# Altium footprint library my Library.PcbLib: 1247 footprints (part 49 of 78)
Each footprint in its own frame and in the unit in brackets; x right, y up, seen from the top. Pads: shape width x height; smd on the part's side, far side on the other; paste and mask are expansions set on the pad; w line width, h text height; cw(c..) or ccw(c..) is an arc to the next point about the centre after c.
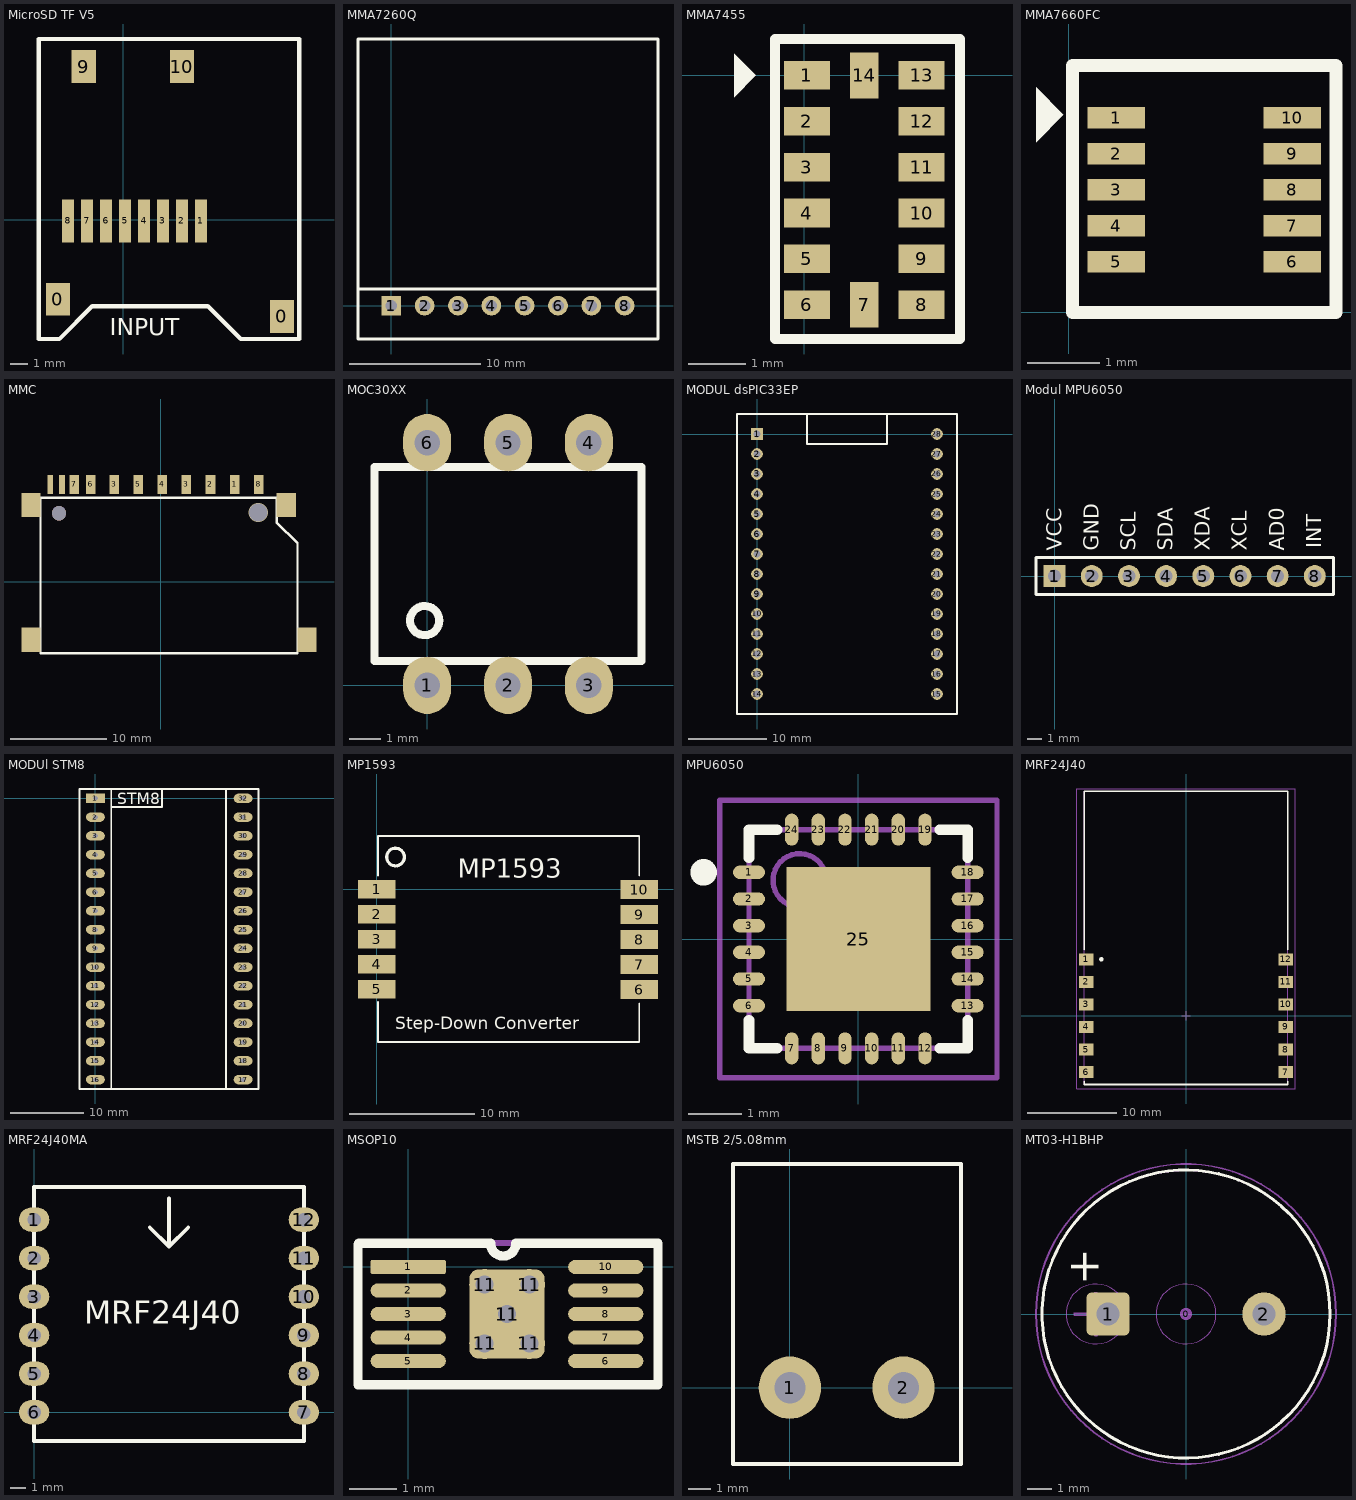
[diagram p48: the footprints below, top view; thin cyan lines are the x and y axes]

## MicroSD TF V5 [mm]
pads (12):
  rect 1.4x1.9 smd: 0(-3.8,-4.6) 0(9.2,-5.6) 9(-2.3,8.9) 10(3.4,8.9)
  rect 0.7x2.5 smd: 1(4.5,-0.054) 2(3.4,-0.054) 3(2.3,-0.054) 4(1.2,-0.054) 5(0.1,-0.054) 6(-1,-0.054) 7(-2.1,-0.054) 8(-3.2,-0.054)
Top Overlay:
  lines w0.254: -4.9,-6.909 -3.979,-6.909 -3.709,-6.909 -1.8,-5 4.9,-5 6.809,-6.909 10.2,-6.909 10.2,10.5 6.4,10.5 -1.4,10.5 -4.9,10.5 -4.9,-6.909
  text "INPUT" at -0.8,-6.7 h1
3D body "User Library-473521001_microSD.STEP": height 2, standoff 0.12, extent -4.35,-5.54 9.75,9.66

## MMA7260Q [mm] "Connector; Header; 8 Position"
pads (8):
  rect 1.5x1.5 hole 0.9: 1(0,0)
  round 1.5 hole 0.9: 2(2.54,0) 3(5.08,0) 4(7.62,0) 5(10.16,0) 6(12.7,0) 7(15.24,0) 8(17.78,0)
Top Overlay:
  lines w0.2: -2.54,1.27 20.32,1.27 ; -2.54,-2.54 20.32,-2.54 20.32,20.32 -2.54,20.32 -2.54,-2.54
3D body: height 1, standoff 0, extent -2.54,-2.54 20.32,20.32
3D body: height 2, standoff 1, extent 7.62,7.62 13.97,13.97

## MMA7455 [mm]
pads (14):
  rect 0.8x0.5 smd: 1(0.051,0) 2(0.051,-0.8) 3(0.051,-1.6) 4(0.051,-2.4) 5(0.051,-3.2) 6(0.051,-4) 8(2.051,-4) 9(2.051,-3.2) 10(2.051,-2.4) 11(2.051,-1.6) 12(2.051,-0.8) 13(2.051,0)
  rect 0.5x0.8 smd: 7(1.051,-4) 14(1.051,0)
Top Overlay:
  region: -1.219,0.381 -0.838,0 -1.219,-0.381
  lines w0.178: -0.508,-4.572 -0.508,0.635 2.718,0.635 2.718,-4.597 ; 2.718,-4.597 -0.508,-4.597 2.718,-4.597

## MMA7660FC [mm]
pads (10):
  rect 0.8x0.3 smd: 1(0.655,2.704) 2(0.655,2.204) 3(0.655,1.704) 4(0.655,1.204) 5(0.655,0.704) 6(3.099,0.704) 7(3.099,1.204) 8(3.099,1.704) 9(3.099,2.204) 10(3.099,2.704)
Top Overlay:
  region: -0.457,3.124 -0.076,2.743 -0.457,2.362
  lines w0.178: 0.051,0 0.051,3.429 3.708,3.429 3.708,0 0.051,0
3D body "User Library-DFN 10 Body 3x3mm Pitch 0_5mm.STEP": height 0.9, standoff -0.05, extent 0.33,0.152 3.43,3.252

## MMC [mm]
pads (15):
  rect 1x2 smd: 1(7.67,10.109) 2(5.17,10.109) 3(-4.83,10.109) 3(2.67,10.109) 4(0.17,10.109) 5(-2.33,10.109) 6(-7.255,10.109) 7(-8.955,10.109) 8(10.17,10.109)
  rect 2x2.5 smd: ""(-13.455,-6.02) ""(-13.455,7.95) ""(13.024,7.95) ""(15.183,-6.02)
  rect 0.6x2 smd: ""(-11.455,10.109) ""(-10.255,10.109)
via -10.555,7.109 diameter 1.476 hole 1.476
via 10.135,7.188 diameter 2 hole 1.898
Top Overlay:
  lines w0.254: -12.471,-7.417 -12.471,8.712 12.04,8.712 12.04,6.172 14.199,4.013 14.199,-7.417 -12.471,-7.417
3D body "User Library-SD Kart.step": height 3, standoff -1, extent -13.436,-20.196 15.164,9.804

## MOC30XX [mm]
pads (6):
  oval 1.5x1.8 hole 0.8: 1(0,0) 2(2.54,0) 3(5.08,0) 4(5.08,7.62) 5(2.54,7.62) 6(0,7.62)
Top Overlay:
  circle w0.254: c-0.077,2.032 r0.458
  lines w0.254: -1.651,0.762 6.731,0.762 6.731,6.858 -1.651,6.858 -1.651,0.762
3D body "SW3DPS-DIP6-DEFAULT.step": height 4.41, standoff -3.18, extent -1.5,-0.19 6.58,7.81

## MODUL dsPIC33EP [mm] "Connector; Header; 14 Position"
height 1.14
pads (28):
  rect 1.5x1.5 hole 0.9: 1(0,0)
  round 1.5 hole 0.9: 2(0,-2.54) 3(0,-5.08) 4(0,-7.62) 5(0,-10.16) 6(0,-12.7) 7(0,-15.24) 8(0,-17.78) 9(0,-20.32) 10(0,-22.86) 11(0,-25.4) 12(0,-27.94) 13(0,-30.48) 14(0,-33.02) 15(22.86,-33.02) 16(22.86,-30.48) 17(22.86,-27.94) 18(22.86,-25.4) 19(22.86,-22.86) 20(22.86,-20.32) 21(22.86,-17.78) 22(22.86,-15.24) 23(22.86,-12.7) 24(22.86,-10.16) 25(22.86,-7.62) 26(22.86,-5.08) 27(22.86,-2.54) 28(22.86,0)
Top Overlay:
  lines w0.2: -2.54,2.54 -2.54,-35.56 25.4,-35.56 25.4,-0.635
  lines w0.254: -2.54,2.54 25.4,2.54 25.4,-0.635 ; 6.35,2.54 6.35,-1.27 16.51,-1.27 16.51,2.54

## Modul MPU6050 [mm] "Connector; Header; 8 Position"
height 1.14
pads (8):
  rect 1.5x1.5 hole 0.9: 1(0,0)
  round 1.5 hole 0.9: 2(2.54,0) 3(5.08,0) 4(7.62,0) 5(10.16,0) 6(12.7,0) 7(15.24,0) 8(17.78,0)
Top Overlay:
  lines w0.2: -1.27,-1.27 19.05,-1.27 19.05,1.27 -1.27,1.27 -1.27,-1.27
  text "VCC" at 0.483,1.727 h1.02
  text "GND" at 3.015,1.727 h1.02
  text "SCL" at 5.548,1.727 h1.02
  text "SDA" at 8.081,1.727 h1.02
  text "XDA" at 10.614,1.727 h1.02
  text "XCL" at 13.146,1.727 h1.02
  text "AD0" at 15.679,1.727 h1.02
  text "INT" at 18.212,1.896 h1.02
3D body "female_header_a-bl254-eg-g08d.stp": height 7.92, standoff -3.78, extent -1.395,-1.257 19.175,1.243

## MODUl STM8 [mm]
pads (32):
  rect 2.54x1.27 hole 0.635: 1(0,0)
  oval 2.54x1.27 hole 0.635: 2(0,-2.54) 3(0,-5.08) 4(0,-7.62) 5(0,-10.16) 6(0,-12.7) 7(0,-15.24) 8(0,-17.78) 9(0,-20.32) 10(0,-22.86) 11(0,-25.4) 12(0,-27.94) 13(0,-30.48) 14(0,-33.02) 15(0,-35.56) 16(0,-38.1) 17(20,-38.1) 18(20,-35.56) 19(20,-33.02) 20(20,-30.48) 21(20,-27.94) 22(20,-25.4) 23(20,-22.86) 24(20,-20.32) 25(20,-17.78) 26(20,-15.24) 27(20,-12.7) 28(20,-10.16) 29(20,-7.62) 30(20,-5.08) 31(20,-2.54) 32(20,0)
Top Overlay:
  lines w0.254: 2.14,-39.31 2.14,1.27 ; 2.14,-1.168 9.017,-1.168 9.017,1.27 ; 17.695,-39.31 17.695,1.27 ; -2.155,-39.37 22.085,-39.37 22.085,1.27 -2.155,1.27 -2.155,-39.37
  text "STM8" at 2.94,-0.77 h1.52

## MP1593 [mm]
height 5
pads (10):
  rect 3x1.5 smd: 1(0,0) 2(0,-2) 3(0,-4) 4(0,-6) 5(0,-8) 6(21,-8.025) 7(21,-6.025) 8(21,-4.025) 9(21,-2.025) 10(21,-0.025)
Top Overlay:
  circle w0.254: c1.5,2.575 r0.707
  lines w0.127: 0.1,-9.025 0.1,-12.225 21,-12.225 21,-9.125 ; 0.1,1.075 0.1,4.26 21,4.26 21,1.075
  text "Step-Down Converter" at 1.5,-11.2 h1
  text "MP1593" at 6.5,0.9 h1.52
3D body: height 5, standoff 0, extent 0,-12.2 21,4.3
3D body: height 5.1, standoff 0, extent 1.104,2.001 2.1,2.999

## MPU6050 [mm] "QFN-24N"
pads (25):
  oval 0.6x0.25 smd: 1(-2.05,1.25) 2(-2.05,0.75) 3(-2.05,0.25) 4(-2.05,-0.25) 5(-2.05,-0.75) 6(-2.05,-1.25) 13(2.05,-1.25) 14(2.05,-0.75) 15(2.05,-0.25) 16(2.05,0.25) 17(2.05,0.75) 18(2.05,1.25)
  oval 0.25x0.6 smd: 7(-1.25,-2.05) 8(-0.75,-2.05) 9(-0.25,-2.05) 10(0.25,-2.05) 11(0.75,-2.05) 12(1.25,-2.05) 19(1.25,2.05) 20(0.75,2.05) 21(0.25,2.05) 22(-0.25,2.05) 23(-0.75,2.05) 24(-1.25,2.05)
  rect 2.7x2.7 smd: 25(0,0)
Top Overlay:
  circle w0.25: c-2.9,1.25 r0.125
  lines w0.2: -2.05,-1.525 -2.05,-2.05 -1.525,-2.05 ; -2.05,1.525 -2.05,2.05 -1.525,2.05 ; 1.525,-2.05 2.05,-2.05 2.05,-1.525 ; 1.525,2.05 2.05,2.05 2.05,1.525
Mechanical 13:
  circle w0.1: c-1.1,1.1 r0.5
  lines w0.1: -2.05,-2.05 2.05,-2.05 2.05,2.05 -2.05,2.05 -2.05,-2.05
Mechanical 15:
  lines w0.1: -0.5,0 0.5,0 ; 0,-0.5 0,0.5 ; -2.6,-2.6 2.6,-2.6 2.6,2.6 -2.6,2.6 -2.6,-2.6
3D body "User Library-QFN24-0_5.STEP": height 1, standoff 0, extent -2,-2 2,2

## MRF24J40 [mm] "LCC, 12-Pins, Pitch 2.54mm, IPC Medium Density"
height 3.429
pads (12):
  rect 1.65x1.35 smd: 1(-11.225,6.35) 2(-11.225,3.81) 3(-11.225,1.27) 4(-11.225,-1.27) 5(-11.225,-3.81) 6(-11.225,-6.35) 7(11.225,-6.35) 8(11.225,-3.81) 9(11.225,-1.27) 10(11.225,1.27) 11(11.225,3.81) 12(11.225,6.35)
Top Overlay:
  circle w0.25: c-9.523,6.35 r0.125
  lines w0.2: -11.45,-7.425 -11.45,-7.747 11.45,-7.747 11.45,-7.425 ; -11.45,7.425 -11.45,25.273 0.195,25.273 ; -0.195,25.273 11.45,25.273 11.45,7.425
Mechanical 13:
  lines w0.1: -11.43,-7.747 -11.43,25.273 11.43,25.273 11.43,-7.747 -11.43,-7.747
Mechanical 15:
  lines w0.1: -0.5,0 0.5,0 ; 0,-0.5 0,0.5 ; -12.325,-8.255 12.325,-8.255 12.325,25.527 -12.325,25.527 -12.325,-8.255
3D body "User Library-MRF24J40MB-1.STEP": height 3.38, standoff 0.01, extent -11.43,-7.62 11.43,25.4

## MRF24J40MA [mm] "Microchip Zigbee Module"
pads (12):
  oval 2x1.6 hole 0.9: 1(0,12.7) 2(0,10.16) 3(0,7.62) 4(0,5.08) 5(0,2.54) 6(0,0) 7(17.78,0) 8(17.78,2.54) 9(17.78,5.08) 10(17.78,7.62) 11(17.78,10.16) 12(17.78,12.7)
Top Overlay:
  lines w0.254: 0,8.255 0,-1.905 ; 7.62,12.192 8.89,10.922 ; 8.89,14.097 8.89,10.922 ; 10.16,12.192 8.89,10.922 ; 0,-1.905 0,14.859 17.78,14.859 17.78,-1.905 0,-1.905
  text "MRF24J40" at 3.302,5.842 h1.52

## MSOP10 [mm]
pads (16):
  rrect25% 1.6x0.3 smd mask+0.05: 1(0,0)
  oval 1.6x0.3 smd mask+0.05: 2(0,-0.5) 3(0,-1) 4(0,-1.5) 5(0,-2) 6(4.2,-2) 7(4.2,-1.5) 8(4.2,-1) 9(4.2,-0.5) 10(4.2,0)
  round 0.66 hole 0.381: 11(1.625,-1.625) 11(1.625,-0.375) 11(2.1,-1) 11(2.575,-1.625) 11(2.575,-0.375)
  rrect25% 1.6x1.9 smd: 11(2.1,-1)
Top Overlay:
  lines w0.2: 1.725,0.5 -1.049,0.5 -1.067,0.483 -1.067,-2.5 5.309,-2.5 5.309,0.5 2.3,0.5 ; 1.75,0.5 ccw(c2.019,0.5) 2.289,0.5
Top Solder:
  rectangle: 1.175,-2.075 3.025,0.075
Mechanical 15:
  lines w0.127: -1.067,-2.489 5.309,-2.489 5.309,0.508 -1.067,0.508 -1.067,-2.489
3D body: height 1.1, standoff 0, extent 0.625,-2.5 3.625,0.525
3D body: height 0.15, standoff 0, extent -0.375,-2.125 4.6,0.125

## MSTB 2/5.08mm [mil]
pads (2):
  round 110 hole 55.12: 1(0,0) 2(200,0)
Top Overlay:
  lines w7: -100.5,-134.5 -100.5,394 301.5,394 301.5,-134.5 -100.5,-134.5
3D body "User Library-MSTB 2,5-2-G-5,08 1770711.STEP": height 339.18, standoff -137.2, extent -99.5,-79 300.5,393.53

## MT03-H1BHP [mm]
height 10.008
pads (3):
  round 0.508 on Mech15: 0(0,0)
  rrect25% 1.8x1.8 hole 0.965: 1(-3.25,0)
  round 1.8 hole 0.965: 2(3.25,0)
Top Overlay:
  circle w0.127: c0,0 r6
  text "+" at -3.2,1.2 h2.29
Mechanical 13:
  circle w0.05: c0,0 r6.25
  circle w0.05: c-3.75,0 r1.25
  circle w0.05: c0,0 r5.996
  circle w0.05: c0,0 r1.25
  circle w0.076: c0.003,-0.012 r6
  lines w0.05: -4.65,-0.05 -4.65,0.05 ; -4.65,-0.05 -4.625,-0.025 ; -4.65,-0.05 -3.775,-0.05 ; -4.65,0.05 -4.625,0.025 ; -4.65,0.05 -3.775,0.05 ; -4.625,-0.025 -4.625,0.025 ; -4.625,-0.025 -3.8,-0.025 ; -4.625,0.025 -3.8,0.025 ; -3.8,-0.9 -3.8,-0.025 ; -3.8,-0.9 -3.775,-0.875 ; -3.8,-0.9 -3.7,-0.9 ; -3.8,-0.025 cw(c-3.8,-0.05) -3.775,-0.05 ; -3.8,0.025 ccw(c-3.8,0.05) -3.775,0.05 ; -3.8,0.025 -3.8,0.9 ; -3.8,0.9 -3.7,0.9 ; -3.8,0.9 -3.775,0.875 ; -3.775,-0.875 -3.775,-0.05 ; -3.775,-0.875 -3.725,-0.875 ; -3.775,0.05 -3.775,0.875 ; -3.775,0.875 -3.725,0.875 ; -3.725,-0.875 -3.725,-0.05 ; -3.725,-0.875 -3.7,-0.9 ; -3.725,-0.05 cw(c-3.7,-0.05) -3.7,-0.025 ; -3.725,-0.05 -2.85,-0.05 ; -3.725,0.05 ccw(c-3.7,0.05) -3.7,0.025 ; -3.725,0.05 -3.725,0.875 ; -3.725,0.05 -2.85,0.05 ; -3.725,0.875 -3.7,0.9 ; -3.7,-0.9 -3.7,-0.025 ; -3.7,-0.025 -2.875,-0.025 ; -3.7,0.025 -2.875,0.025 ; -3.7,0.025 -3.7,0.9 ; -2.875,-0.025 -2.85,-0.05 ; -2.875,-0.025 -2.875,0.025 ; -2.875,0.025 -2.85,0.05 ; -2.85,-0.05 -2.85,0.05
Mechanical 15:
  circle w0.076: c0,0 r6.25
3D body "Buzzer MT03-H1BHP.STEP": height 10, standoff -2.8, extent -6.249,-6.249 6.25,6.25